# Altium schematic symbol library SCHLIB.SchLib: 2608 symbols (part 8 of 20) (continued)
## IC-STM32F446RCT6TR (continued)

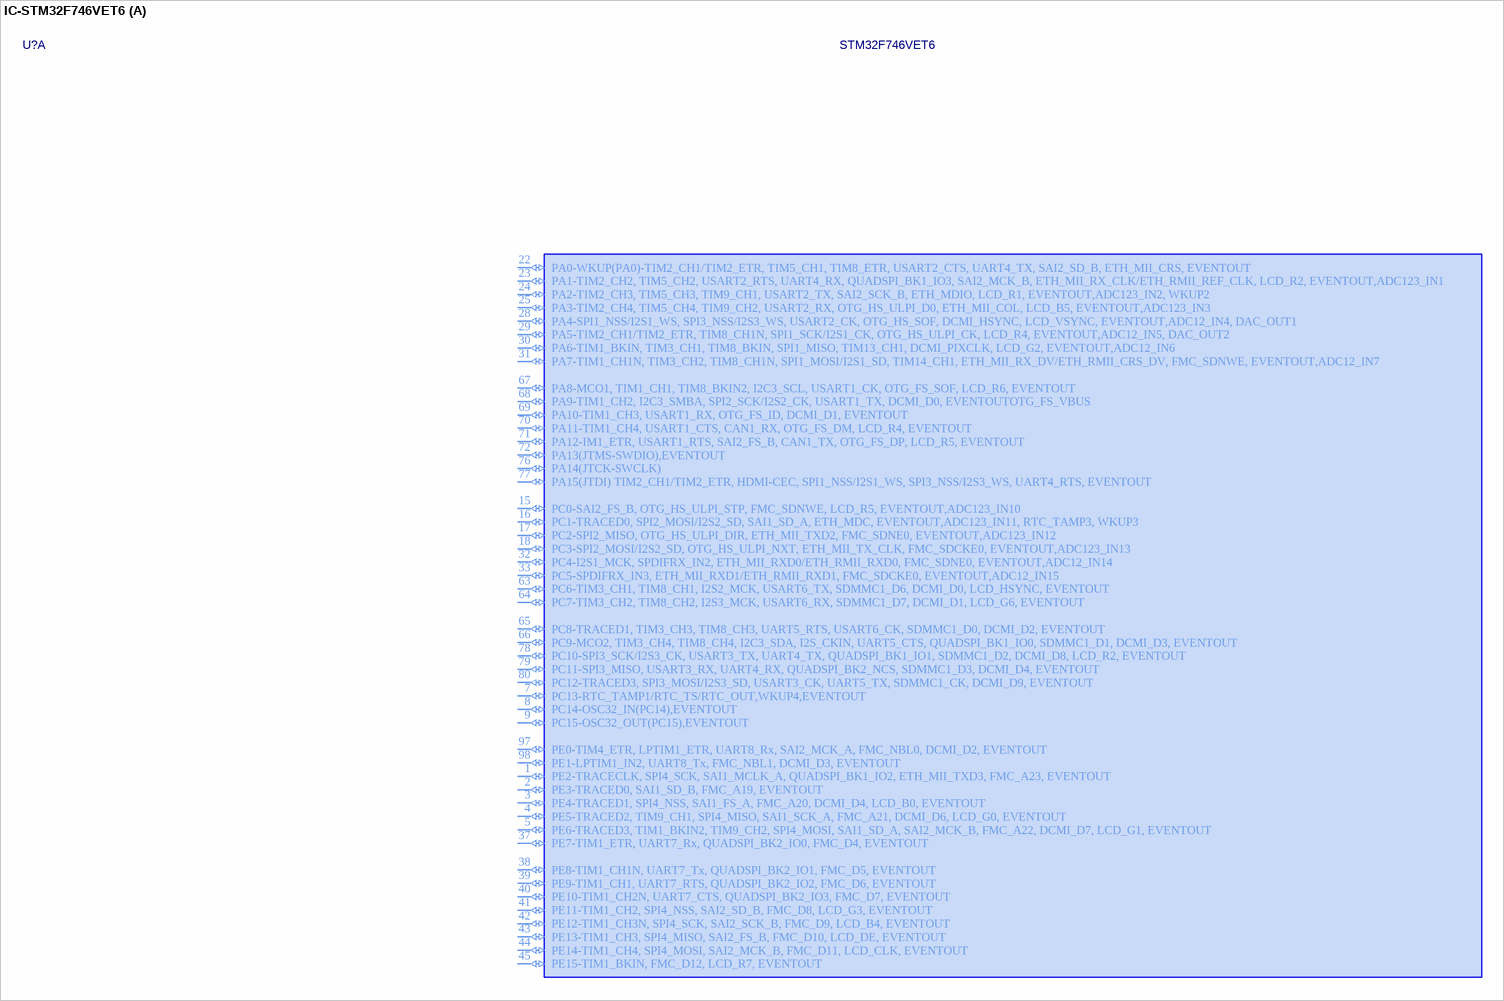
[diagram p32: symbol IC-STM32F746VET6]

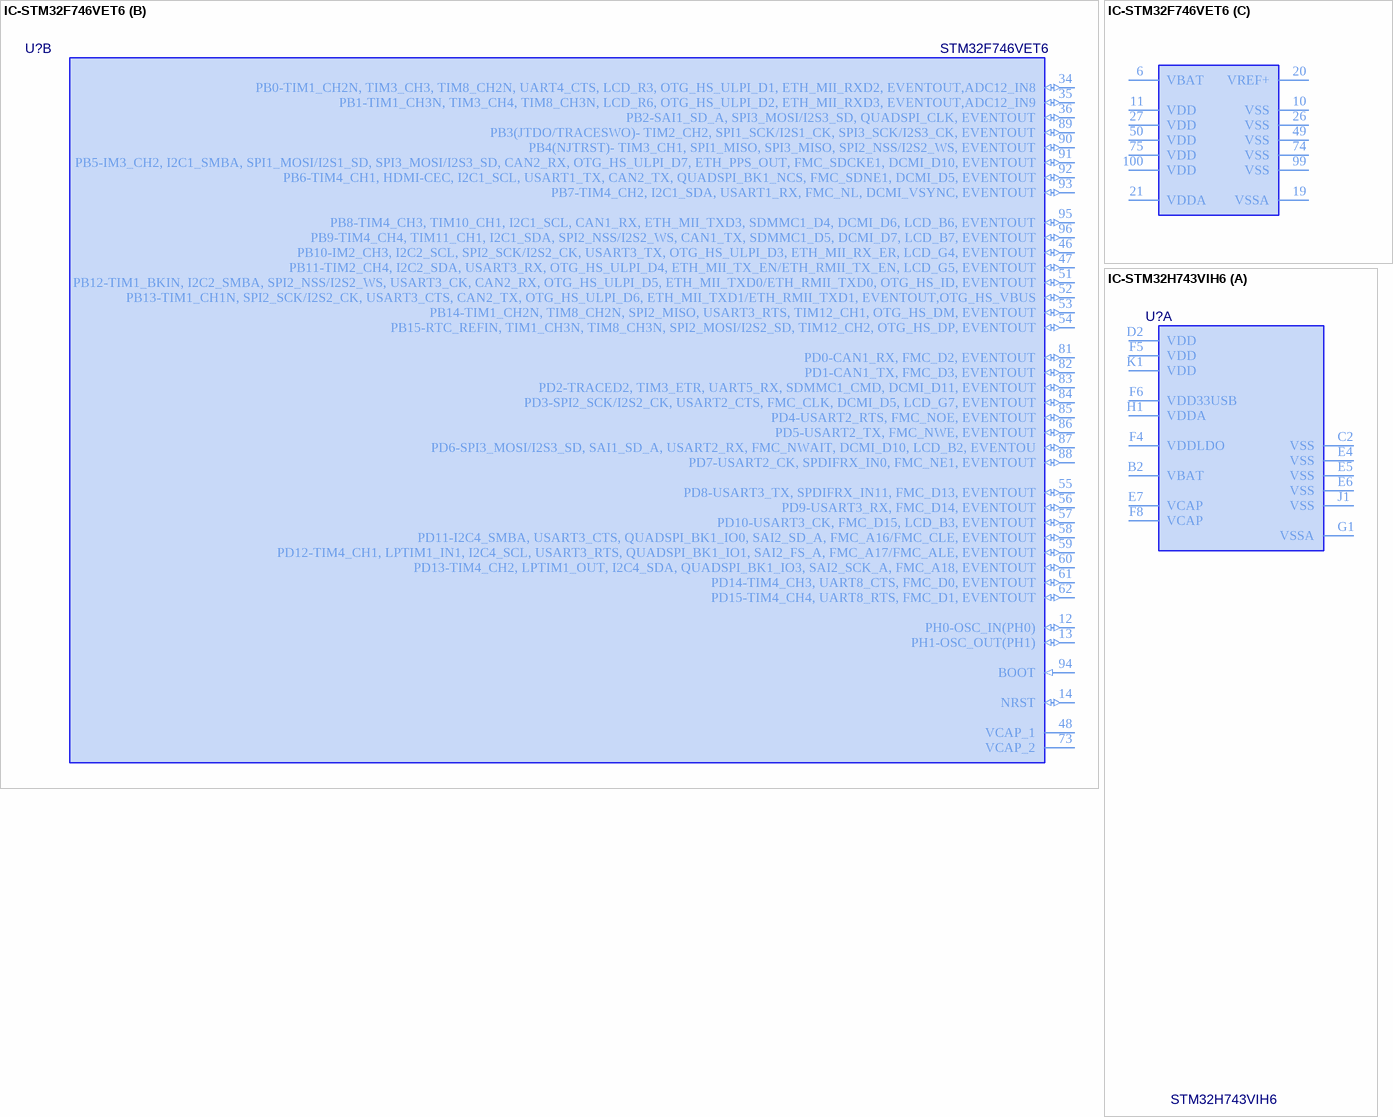
[diagram p33: symbols IC-STM32F746VET6 to IC-STM32H743VIH6]

## IC-STM32F746VET6
designator U?, comment STM32F746VET6
IC MCU 32BIT 512KB FLASH 100LQFP; Manufacturer: STMicroelectronics; Program Memory Size: 512 KByte; Packing: Tray; Supply Voltage Max: 3.6 V; Supply Voltage Min: 1.7 V; Data RAM Size: 320 KByte; L1 Cache Instruction Memory: 4 KByte; Clock Frequency Max: 216 MHz; Number of I/Os: 82; Frequency: 216MHz; RAM Size: 340KB; Min Supply Voltage: 1.7V; Max Supply Voltage: 3.6V; Washability: OK; PackageDescription: 100-Pin Low Profile Quad Flat Package, 14 x 14 mm Body, 0.5 mm Pitch; ComponentLink3URL: http://www.st.com/st-web-ui/static/active/en/resource/technical/document/data_brief/DM00071938.pdf; ComponentLink2URL: http://www.st.com/st-web-ui/static/active/en/resource/technical/document/datasheet/DM00166116.pdf; Mounting Technology: Surface Mount; Temperature Max: 85 degC; ComponentLink1Description: Manufacturer URL; ComponentLink3Description: Package Specification; Temperature Min: -40 degC; PartNumber: STM32F746VE; ComponentLink2Description: Datasheet; ComponentLink1URL: http://www.st.com/web/en/home.html; L1 Cache Data Memory: 4 KByte; DatasheetVersion: Rev. 1; Supplier 1: Digi-Key; Manufacturer Part Number: STM32F746VET6; Stock 1: 527; Pricing 1: 1=11.87000, 10=10.72200, 100=8.87720, 500=7.73016, 1000=6.73272 (USD); RoHS: No; Case/Package: LQFP; Number of Pins: 100; Memory Size: 512KB; REACH SVHC: No SVHC; ComponentLink4URL: http://www.mouser.com/ds/2/389/stm32f745ie-956321.pdf?src-supplier=Mouser; ComponentLink4Description: http://www.mouser.com/ds/2/389/stm32f745ie-956321.pdf?src-supplier=Mouser; ComponentLink5URL: http://www.farnell.com/datasheets/1994626.pdf?src-supplier=Farnell; ComponentLink5Description: http://www.farnell.com/datasheets/1994626.pdf?src-supplier=Farnell; ComponentLink6URL: http://www.farnell.com/datasheets/1994626.pdf?src-supplier=Element14; ComponentLink6Description: http://www.farnell.com/datasheets/1994626.pdf?src-supplier=Element14; ComponentLink7URL: http://www.st.com/content/ccc/resource/technical/document/errata_sheet/4d/39/a6/8c/84/47/47/67/DM00145382.pdf/files/DM00145382.pdf/jcr:content/translations/en.DM00145382.pdf?src-supplier=Digi-Key; ComponentLink7Description: http://www.st.com/content/ccc/resource/technical/document/errata_sheet/4d/39/a6/8c/84/47/47/67/DM00145382.pdf/files/DM00145382.pdf/jcr:content/translations/en.DM00145382.pdf?src-supplier=Digi-Key; Supplier Part Number 1: 497-16607-ND
footprint STM-LQFP100_V (Thin QFP, 100-Leads, Body 14x14mm, Pitch 0.5mm, ST Recommended)
part A pins: 1 PE2-TRACECLK, SPI4_SCK, SAI1_MCLK_A, QUADSPI_BK1_IO2, ETH_MII_TXD3, FMC_A23, EVENTOUT (io), 2 PE3-TRACED0, SAI1_SD_B, FMC_A19, EVENTOUT (io), 3 PE4-TRACED1, SPI4_NSS, SAI1_FS_A, FMC_A20, DCMI_D4, LCD_B0, EVENTOUT (io), 4 PE5-TRACED2, TIM9_CH1, SPI4_MISO, SAI1_SCK_A, FMC_A21, DCMI_D6, LCD_G0, EVENTOUT (io), 5 PE6-TRACED3, TIM1_BKIN2, TIM9_CH2, SPI4_MOSI, SAI1_SD_A, SAI2_MCK_B, FMC_A22, DCMI_D7, LCD_G1, EVENTOUT (io), 7 PC13-RTC_TAMP1/RTC_TS/RTC_OUT,WKUP4,EVENTOUT (io), 8 PC14-OSC32_IN(PC14),EVENTOUT (io), 9 PC15-OSC32_OUT(PC15),EVENTOUT (io), 15 PC0-SAI2_FS_B, OTG_HS_ULPI_STP, FMC_SDNWE, LCD_R5, EVENTOUT,ADC123_IN10 (io), 16 PC1-TRACED0, SPI2_MOSI/I2S2_SD, SAI1_SD_A, ETH_MDC, EVENTOUT,ADC123_IN11, RTC_TAMP3, WKUP3 (io), 17 PC2-SPI2_MISO, OTG_HS_ULPI_DIR, ETH_MII_TXD2, FMC_SDNE0, EVENTOUT,ADC123_IN12 (io), 18 PC3-SPI2_MOSI/I2S2_SD, OTG_HS_ULPI_NXT, ETH_MII_TX_CLK, FMC_SDCKE0, EVENTOUT,ADC123_IN13 (io), 22 PA0-WKUP(PA0)-TIM2_CH1/TIM2_ETR, TIM5_CH1, TIM8_ETR, USART2_CTS, UART4_TX, SAI2_SD_B, ETH_MII_CRS, EVENTOUT (io), 23 PA1-TIM2_CH2, TIM5_CH2, USART2_RTS, UART4_RX, QUADSPI_BK1_IO3, SAI2_MCK_B, ETH_MII_RX_CLK/ETH_RMII_REF_CLK, LCD_R2, EVENTOUT,ADC123_IN1 (io), 24 PA2-TIM2_CH3, TIM5_CH3, TIM9_CH1, USART2_TX, SAI2_SCK_B, ETH_MDIO, LCD_R1, EVENTOUT,ADC123_IN2, WKUP2 (io), 25 PA3-TIM2_CH4, TIM5_CH4, TIM9_CH2, USART2_RX, OTG_HS_ULPI_D0, ETH_MII_COL, LCD_B5, EVENTOUT,ADC123_IN3 (io), 28 PA4-SPI1_NSS/I2S1_WS, SPI3_NSS/I2S3_WS, USART2_CK, OTG_HS_SOF, DCMI_HSYNC, LCD_VSYNC, EVENTOUT,ADC12_IN4, DAC_OUT1 (io), 29 PA5-TIM2_CH1/TIM2_ETR, TIM8_CH1N, SPI1_SCK/I2S1_CK, OTG_HS_ULPI_CK, LCD_R4, EVENTOUT,ADC12_IN5, DAC_OUT2 (io), 30 PA6-TIM1_BKIN, TIM3_CH1, TIM8_BKIN, SPI1_MISO, TIM13_CH1, DCMI_PIXCLK, LCD_G2, EVENTOUT,ADC12_IN6 (io), 31 PA7-TIM1_CH1N, TIM3_CH2, TIM8_CH1N, SPI1_MOSI/I2S1_SD, TIM14_CH1, ETH_MII_RX_DV/ETH_RMII_CRS_DV, FMC_SDNWE, EVENTOUT,ADC12_IN7 (io), 32 PC4-I2S1_MCK, SPDIFRX_IN2, ETH_MII_RXD0/ETH_RMII_RXD0, FMC_SDNE0, EVENTOUT,ADC12_IN14 (io), 33 PC5-SPDIFRX_IN3, ETH_MII_RXD1/ETH_RMII_RXD1, FMC_SDCKE0, EVENTOUT,ADC12_IN15 (io), 37 PE7-TIM1_ETR, UART7_Rx, QUADSPI_BK2_IO0, FMC_D4, EVENTOUT (io), 38 PE8-TIM1_CH1N, UART7_Tx, QUADSPI_BK2_IO1, FMC_D5, EVENTOUT (io), 39 PE9-TIM1_CH1, UART7_RTS, QUADSPI_BK2_IO2, FMC_D6, EVENTOUT (io), 40 PE10-TIM1_CH2N, UART7_CTS, QUADSPI_BK2_IO3, FMC_D7, EVENTOUT (io), 41 PE11-TIM1_CH2, SPI4_NSS, SAI2_SD_B, FMC_D8, LCD_G3, EVENTOUT (io), 42 PE12-TIM1_CH3N, SPI4_SCK, SAI2_SCK_B, FMC_D9, LCD_B4, EVENTOUT (io), 43 PE13-TIM1_CH3, SPI4_MISO, SAI2_FS_B, FMC_D10, LCD_DE, EVENTOUT (io), 44 PE14-TIM1_CH4, SPI4_MOSI, SAI2_MCK_B, FMC_D11, LCD_CLK, EVENTOUT (io), 45 PE15-TIM1_BKIN, FMC_D12, LCD_R7, EVENTOUT (io), 63 PC6-TIM3_CH1, TIM8_CH1, I2S2_MCK, USART6_TX, SDMMC1_D6, DCMI_D0, LCD_HSYNC, EVENTOUT (io), 64 PC7-TIM3_CH2, TIM8_CH2, I2S3_MCK, USART6_RX, SDMMC1_D7, DCMI_D1, LCD_G6, EVENTOUT (io), 65 PC8-TRACED1, TIM3_CH3, TIM8_CH3, UART5_RTS, USART6_CK, SDMMC1_D0, DCMI_D2, EVENTOUT (io), 66 PC9-MCO2, TIM3_CH4, TIM8_CH4, I2C3_SDA, I2S_CKIN, UART5_CTS, QUADSPI_BK1_IO0, SDMMC1_D1, DCMI_D3, EVENTOUT (io), 67 PA8-MCO1, TIM1_CH1, TIM8_BKIN2, I2C3_SCL, USART1_CK, OTG_FS_SOF, LCD_R6, EVENTOUT (io), 68 PA9-TIM1_CH2, I2C3_SMBA, SPI2_SCK/I2S2_CK, USART1_TX, DCMI_D0, EVENTOUTOTG_FS_VBUS (io), 69 PA10-TIM1_CH3, USART1_RX, OTG_FS_ID, DCMI_D1, EVENTOUT (io), 70 PA11-TIM1_CH4, USART1_CTS, CAN1_RX, OTG_FS_DM, LCD_R4, EVENTOUT (io), 71 PA12-IM1_ETR, USART1_RTS, SAI2_FS_B, CAN1_TX, OTG_FS_DP, LCD_R5, EVENTOUT (io), 72 PA13(JTMS-SWDIO),EVENTOUT (io), 76 PA14(JTCK-SWCLK) (io), 77 PA15(JTDI) TIM2_CH1/TIM2_ETR, HDMI-CEC, SPI1_NSS/I2S1_WS, SPI3_NSS/I2S3_WS, UART4_RTS, EVENTOUT (io), 78 PC10-SPI3_SCK/I2S3_CK, USART3_TX, UART4_TX, QUADSPI_BK1_IO1, SDMMC1_D2, DCMI_D8, LCD_R2, EVENTOUT (io), 79 PC11-SPI3_MISO, USART3_RX, UART4_RX, QUADSPI_BK2_NCS, SDMMC1_D3, DCMI_D4, EVENTOUT (io), 80 PC12-TRACED3, SPI3_MOSI/I2S3_SD, USART3_CK, UART5_TX, SDMMC1_CK, DCMI_D9, EVENTOUT (io), 97 PE0-TIM4_ETR, LPTIM1_ETR, UART8_Rx, SAI2_MCK_A, FMC_NBL0, DCMI_D2, EVENTOUT (io), 98 PE1-LPTIM1_IN2, UART8_Tx, FMC_NBL1, DCMI_D3, EVENTOUT (io)
part B pins: 12 PH0-OSC_IN(PH0) (io), 13 PH1-OSC_OUT(PH1) (io), 14 NRST (io), 34 PB0-TIM1_CH2N, TIM3_CH3, TIM8_CH2N, UART4_CTS, LCD_R3, OTG_HS_ULPI_D1, ETH_MII_RXD2, EVENTOUT,ADC12_IN8 (io), 35 PB1-TIM1_CH3N, TIM3_CH4, TIM8_CH3N, LCD_R6, OTG_HS_ULPI_D2, ETH_MII_RXD3, EVENTOUT,ADC12_IN9 (io), 36 PB2-SAI1_SD_A, SPI3_MOSI/I2S3_SD, QUADSPI_CLK, EVENTOUT (io), 46 PB10-IM2_CH3, I2C2_SCL, SPI2_SCK/I2S2_CK, USART3_TX, OTG_HS_ULPI_D3, ETH_MII_RX_ER, LCD_G4, EVENTOUT (io), 47 PB11-TIM2_CH4, I2C2_SDA, USART3_RX, OTG_HS_ULPI_D4, ETH_MII_TX_EN/ETH_RMII_TX_EN, LCD_G5, EVENTOUT (io), 48 VCAP_1 (power), 51 PB12-TIM1_BKIN, I2C2_SMBA, SPI2_NSS/I2S2_WS, USART3_CK, CAN2_RX, OTG_HS_ULPI_D5, ETH_MII_TXD0/ETH_RMII_TXD0, OTG_HS_ID, EVENTOUT (io), 52 PB13-TIM1_CH1N, SPI2_SCK/I2S2_CK, USART3_CTS, CAN2_TX, OTG_HS_ULPI_D6, ETH_MII_TXD1/ETH_RMII_TXD1, EVENTOUT,OTG_HS_VBUS (io), 53 PB14-TIM1_CH2N, TIM8_CH2N, SPI2_MISO, USART3_RTS, TIM12_CH1, OTG_HS_DM, EVENTOUT (io), 54 PB15-RTC_REFIN, TIM1_CH3N, TIM8_CH3N, SPI2_MOSI/I2S2_SD, TIM12_CH2, OTG_HS_DP, EVENTOUT (io), 55 PD8-USART3_TX, SPDIFRX_IN11, FMC_D13, EVENTOUT (io), 56 PD9-USART3_RX, FMC_D14, EVENTOUT (io), 57 PD10-USART3_CK, FMC_D15, LCD_B3, EVENTOUT (io), 58 PD11-I2C4_SMBA, USART3_CTS, QUADSPI_BK1_IO0, SAI2_SD_A, FMC_A16/FMC_CLE, EVENTOUT (io), 59 PD12-TIM4_CH1, LPTIM1_IN1, I2C4_SCL, USART3_RTS, QUADSPI_BK1_IO1, SAI2_FS_A, FMC_A17/FMC_ALE, EVENTOUT (io), 60 PD13-TIM4_CH2, LPTIM1_OUT, I2C4_SDA, QUADSPI_BK1_IO3, SAI2_SCK_A, FMC_A18, EVENTOUT (io), 61 PD14-TIM4_CH3, UART8_CTS, FMC_D0, EVENTOUT (io), 62 PD15-TIM4_CH4, UART8_RTS, FMC_D1, EVENTOUT (io), 73 VCAP_2 (power), 81 PD0-CAN1_RX, FMC_D2, EVENTOUT (io), 82 PD1-CAN1_TX, FMC_D3, EVENTOUT (io), 83 PD2-TRACED2, TIM3_ETR, UART5_RX, SDMMC1_CMD, DCMI_D11, EVENTOUT (io), 84 PD3-SPI2_SCK/I2S2_CK, USART2_CTS, FMC_CLK, DCMI_D5, LCD_G7, EVENTOUT (io), 85 PD4-USART2_RTS, FMC_NOE, EVENTOUT (io), 86 PD5-USART2_TX, FMC_NWE, EVENTOUT (io), 87 PD6-SPI3_MOSI/I2S3_SD, SAI1_SD_A, USART2_RX, FMC_NWAIT, DCMI_D10, LCD_B2, EVENTOU (io), 88 PD7-USART2_CK, SPDIFRX_IN0, FMC_NE1, EVENTOUT (io), 89 PB3(JTDO/TRACESWO)- TIM2_CH2, SPI1_SCK/I2S1_CK, SPI3_SCK/I2S3_CK, EVENTOUT (io), 90 PB4(NJTRST)- TIM3_CH1, SPI1_MISO, SPI3_MISO, SPI2_NSS/I2S2_WS, EVENTOUT (io), 91 PB5-IM3_CH2, I2C1_SMBA, SPI1_MOSI/I2S1_SD, SPI3_MOSI/I2S3_SD, CAN2_RX, OTG_HS_ULPI_D7, ETH_PPS_OUT, FMC_SDCKE1, DCMI_D10, EVENTOUT (io), 92 PB6-TIM4_CH1, HDMI-CEC, I2C1_SCL, USART1_TX, CAN2_TX, QUADSPI_BK1_NCS, FMC_SDNE1, DCMI_D5, EVENTOUT (io), 93 PB7-TIM4_CH2, I2C1_SDA, USART1_RX, FMC_NL, DCMI_VSYNC, EVENTOUT (io), 94 BOOT (in), 95 PB8-TIM4_CH3, TIM10_CH1, I2C1_SCL, CAN1_RX, ETH_MII_TXD3, SDMMC1_D4, DCMI_D6, LCD_B6, EVENTOUT (io), 96 PB9-TIM4_CH4, TIM11_CH1, I2C1_SDA, SPI2_NSS/I2S2_WS, CAN1_TX, SDMMC1_D5, DCMI_D7, LCD_B7, EVENTOUT (io)
part C pins: 6 VBAT (power), 10 VSS (power), 11 VDD (power), 19 VSSA (power), 20 VREF+ (power), 21 VDDA (power), 26 VSS (power), 27 VDD (power), 49 VSS (power), 50 VDD (power), 74 VSS (power), 75 VDD (power), 99 VSS (power), 100 VDD (power)

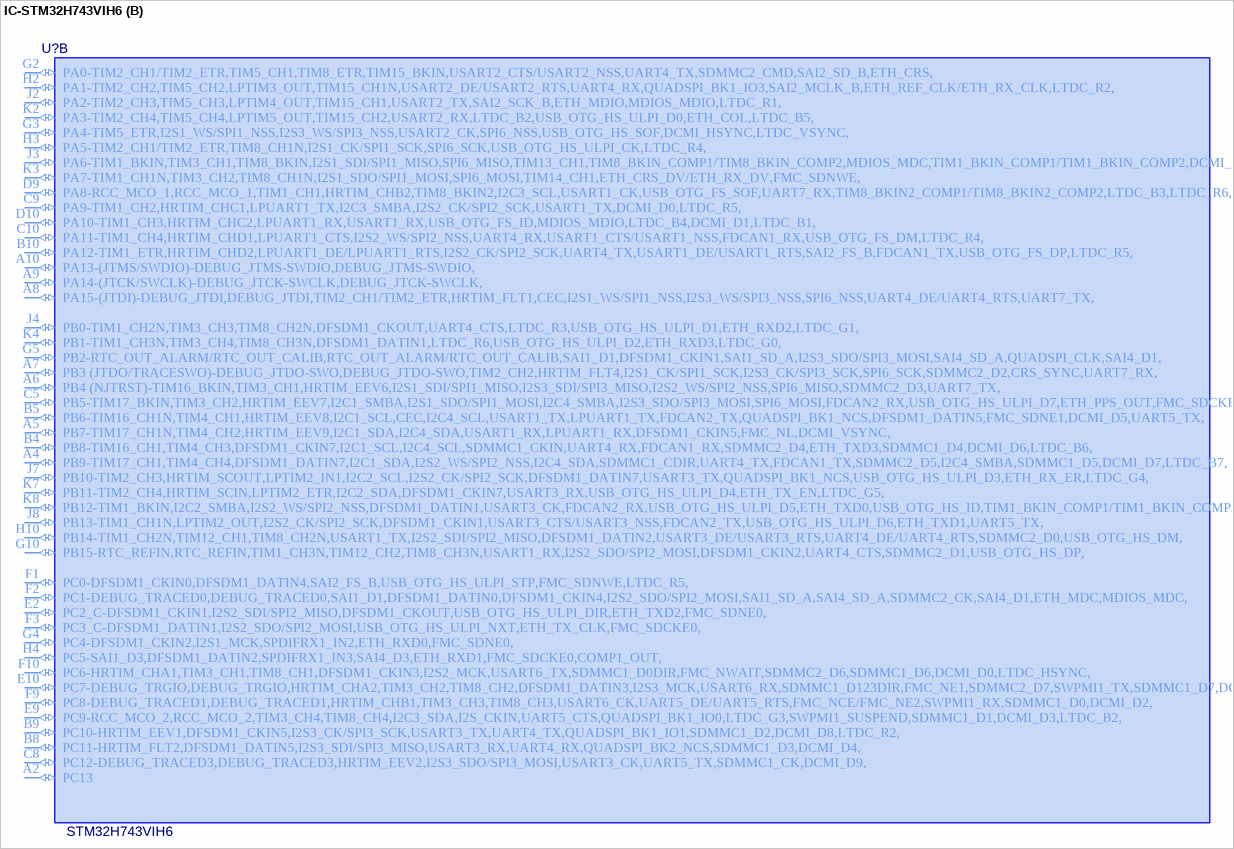
[diagram p34: symbol IC-STM32H743VIH6]

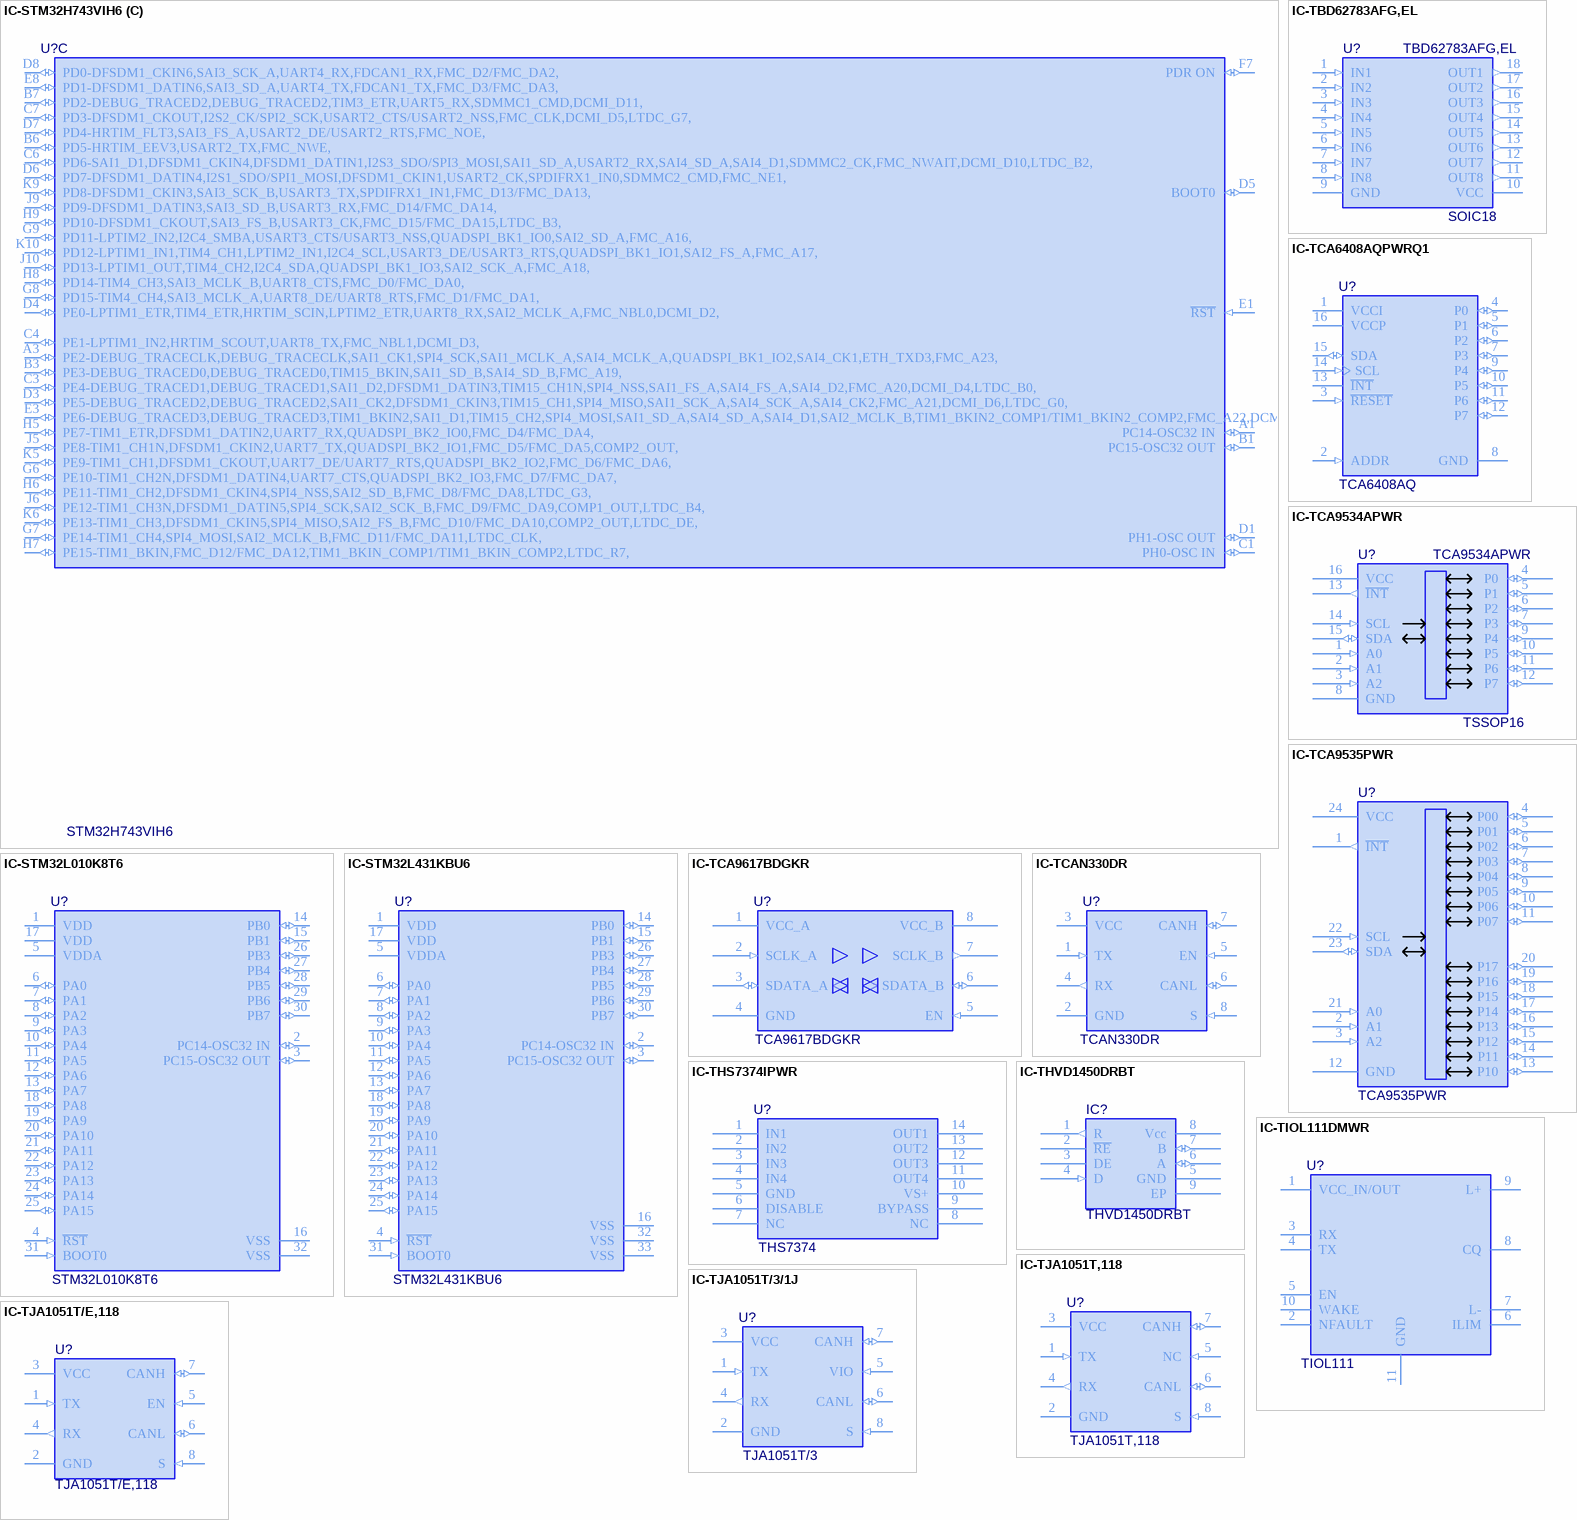
[diagram p35: symbols IC-STM32H743VIH6 to IC-TJA1051T/E,118]
